# Altium footprint library SG_PCB_Fomin.PcbLib: 74 footprints (part 5 of 5)
Each footprint in its own frame and in the unit in brackets; x right, y up, seen from the top. Pads: shape width x height; smd on the part's side, far side on the other; paste and mask are expansions set on the pad; w line width, h text height; cw(c..) or ccw(c..) is an arc to the next point about the centre after c.
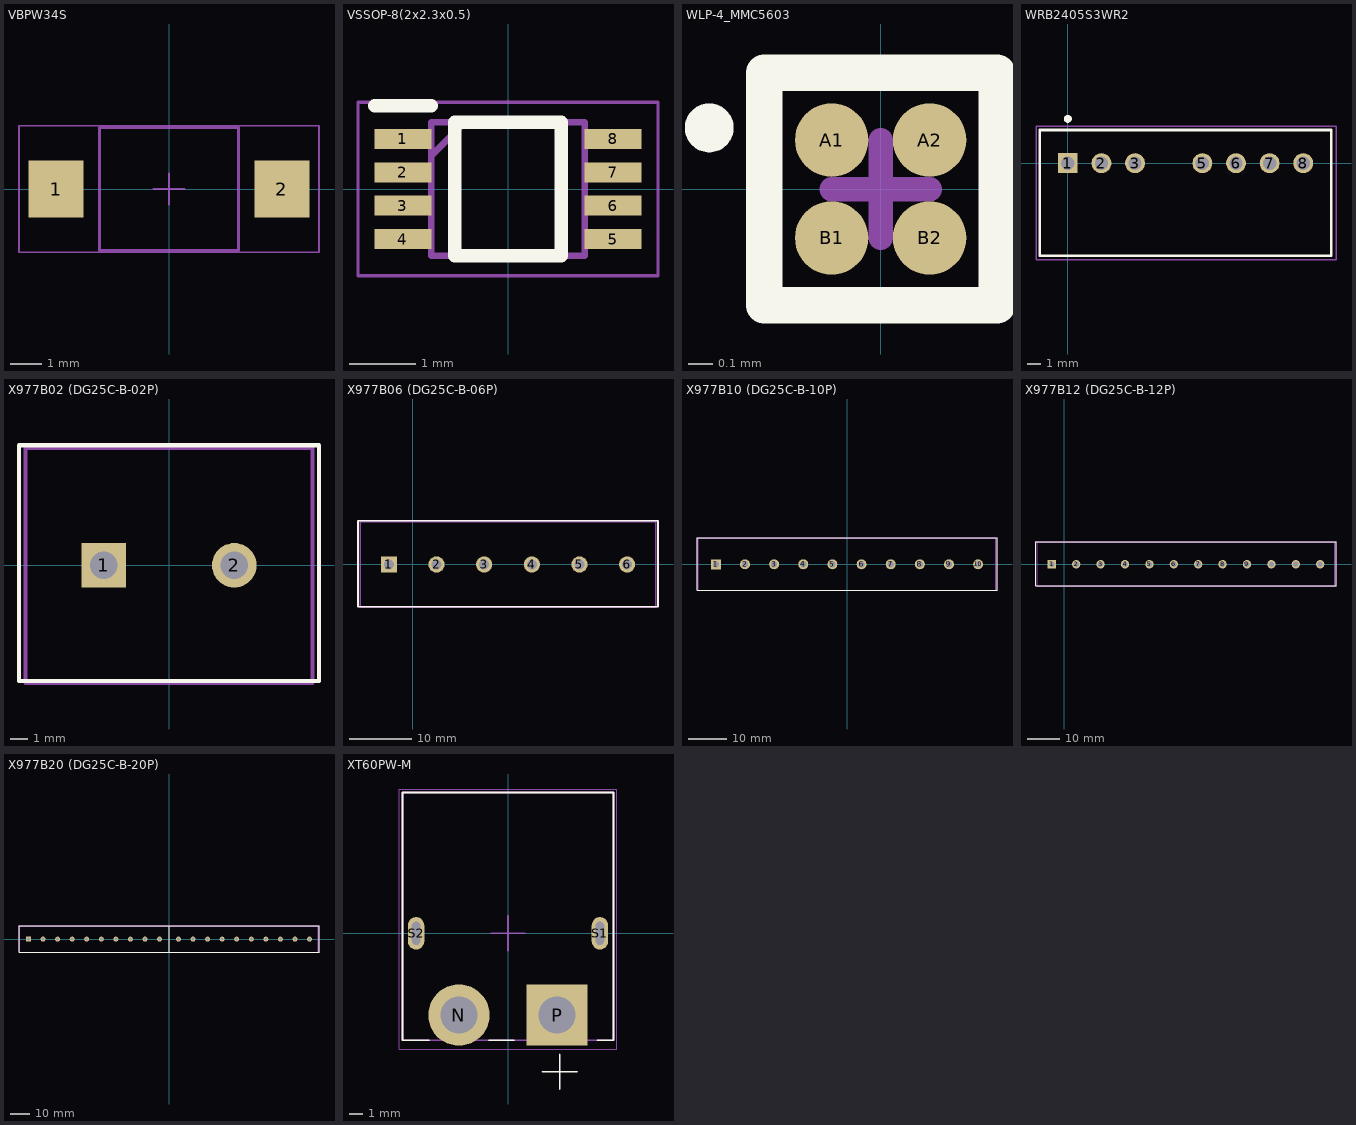
[diagram p4: the footprints below, top view; thin cyan lines are the x and y axes]

## VBPW34S [mm] "Photodiode"
pads (2):
  rect 1.75x1.8 smd: 1(-3.575,0) 2(3.575,0)
Top Courtyard:
  lines w0.05: -0.5,0 0.5,0 ; 0,-0.5 0,0.5 ; -4.75,-2 -4.75,2 4.75,2 4.75,-2 -4.75,-2
Top 3D Body:
  lines w0.1: -2.2,-1.95 2.2,-1.95 2.2,1.95 -2.2,1.95 -2.2,-1.95
3D body "User Library-bpw34s.step": height 1.22, standoff 0, extent -3.204,-1.95 3.204,1.95

## VSSOP-8(2x2.3x0.5) [mm]
pads (8):
  rect 0.85x0.3 smd: 1(-1.575,0.75) 2(-1.575,0.25) 3(-1.575,-0.25) 4(-1.575,-0.75) 5(1.575,-0.75) 6(1.575,-0.25) 7(1.575,0.25) 8(1.575,0.75)
Top Overlay:
  lines w0.2: -2,1.25 -1.15,1.25 ; -0.8,-1 -0.8,1 0.8,1 0.8,-1 -0.8,-1
Top Assembly:
  lines w0.1: -1.15,0.5 -0.65,1 ; -1.15,-1 -1.15,1 1.15,1 1.15,-1 -1.15,-1
Top Courtyard:
  lines w0.05: -2.25,-1.3 -2.25,1.3 2.25,1.3 2.25,-1.3 -2.25,-1.3
3D body "PCA9306DCUR.stp": height 0.77, standoff 0, extent -1.55,-1 1.55,1

## WLP-4_MMC5603 [mm]
pads (4):
  round 0.3 smd: A1(-0.2,0.2) A2(0.2,0.2) B1(-0.2,-0.2) B2(0.2,-0.2)
Top Overlay:
  lines w0.1: -0.7,0.2 ccw(c-0.7,0.25) -0.7,0.3 ccw(c-0.7,0.25) -0.7,0.2
  lines w0.15: -0.475,-0.475 0.475,-0.475 0.475,0.475 -0.475,0.475 -0.475,-0.475
Top Assembly:
  lines w0.05: -0.45,-0.45 0.45,-0.45 0.45,0.45 -0.45,0.45 -0.45,-0.45
Top Courtyard:
  lines w0.05: -0.475,-0.475 0.475,-0.475 0.475,0.475 -0.475,0.475 -0.475,-0.475
  lines w0.1: -0.2,0 0.2,0 ; 0,-0.2 0,0.2
Top Designator:
  text ".Designator" at -11.218,1.492 h1.52
3D body "MMC5603NJ.stp": height 0.7, standoff 0, extent -0.41,-0.41 0.41,0.41

## WRB2405S3WR2 [mm]
pads (7):
  rect 1.5x1.5 hole 1: 1(0,0)
  round 1.5 hole 1: 2(2.54,0) 3(5.08,0) 5(10.16,0) 6(12.7,0) 7(15.24,0) 8(17.78,0)
Top Overlay:
  lines w0.2: -2.11,-7 19.89,-7 19.89,2.5 -2.11,2.5 -2.11,-7
  lines w0.5: 0,3.3 cw(c0,3.35) 0,3.4 cw(c0,3.35) 0,3.3
Top Assembly:
  lines w0.1: -2.11,-7 -2.11,2.5 19.89,2.5 19.89,-7 -2.11,-7
Top Courtyard:
  lines w0.1: -2.4,-7.3 20.25,-7.3 20.25,2.8 -2.4,2.8 -2.4,-7.3
Top Designator:
  text ".Designator" at 4.2,-2.533 h0.8
3D body "WRB2405S-3WR2.stp": height 12.35, standoff -5, extent -2.11,-7 19.89,2.5

## X977B02 (DG25C-B-02P) [mm]
pads (2):
  rect 2.6x2.6 hole 1.6: 1(-3.81,0)
  round 2.6 hole 1.6: 2(3.81,0)
Top Overlay:
  lines w0.25: -8.75,-6.75 8.75,-6.75 8.75,7 -8.75,7 -8.75,-6.75
Top Assembly:
  lines w0.25: -8.37,-6.85 8.37,-6.85 8.37,6.85 -8.37,6.85 -8.37,-6.85
Top Courtyard:
  lines w0.2: -8.75,-6.75 8.75,-6.75 8.75,7 -8.75,7 -8.75,-6.75
Top Designator:
  text ".Designator" at -3.3,-0.033 h0.8
3D body "User Library-DG25C-1.STEP": height 14.8, standoff -4.79, extent -8.37,-6.484 8.37,6.75

## X977B06 (DG25C-B-06P) [mm]
pads (6):
  rect 2.6x2.6 hole 1.6: 1(-3.81,0)
  round 2.6 hole 1.6: 2(3.81,0) 3(11.43,0) 4(19.05,0) 5(26.67,0) 6(34.29,0)
Top Overlay:
  lines w0.25: 6.49,-6.75 23.99,-6.75 ; 6.49,7 23.99,7 ; 8.75,-6.75 -8.75,-6.75 -8.75,7 8.75,7 ; 21.73,-6.75 39.23,-6.75 39.23,7 21.73,7
Top Assembly:
  lines w0.25: 6.87,-6.85 23.61,-6.85 ; 6.87,6.85 23.61,6.85 ; 8.37,-6.85 -8.37,-6.85 -8.37,6.85 8.37,6.85 ; 22.11,-6.85 38.85,-6.85 38.85,6.85 22.11,6.85
Top Courtyard:
  lines w0.2: 6.49,-6.75 23.99,-6.75 ; 6.49,7 23.99,7 ; 8.75,-6.75 -8.75,-6.75 -8.75,7 8.75,7 ; 21.73,-6.75 39.23,-6.75 39.23,7 21.73,7
Top Designator:
  text ".Designator" at -3.3,-0.033 h0.8
3D body "User Library-DG25C-1.STEP": height 14.8, standoff -4.79, extent 22.11,-6.484 38.85,6.75
3D body "User Library-DG25C-1.STEP": height 14.8, standoff -4.79, extent 6.87,-6.484 23.61,6.75
3D body "User Library-DG25C-1.STEP": height 14.8, standoff -4.79, extent -8.37,-6.484 8.37,6.75

## X977B10 (DG25C-B-10P) [mm]
pads (10):
  rect 2.6x2.6 hole 1.6: 1(-34.29,0)
  round 2.6 hole 1.6: 2(-26.67,0) 3(-19.05,0) 4(-11.43,0) 5(-3.81,0) 6(3.81,0) 7(11.43,0) 8(19.05,0) 9(26.67,0) 10(34.29,0)
Top Overlay:
  lines w0.25: -23.99,-6.75 -6.49,-6.75 ; -23.99,7 -6.49,7 ; -21.73,-6.75 -39.23,-6.75 -39.23,7 -21.73,7 ; -8.75,-6.75 8.75,-6.75 ; -8.75,7 8.75,7 ; 6.49,-6.75 23.99,-6.75 ; 6.49,7 23.99,7 ; 21.73,-6.75 39.23,-6.75 39.23,7 21.73,7
Top Assembly:
  lines w0.25: -23.61,-6.85 -6.87,-6.85 ; -23.61,6.85 -6.87,6.85 ; -22.11,-6.85 -38.85,-6.85 -38.85,6.85 -22.11,6.85 ; -8.37,-6.85 8.37,-6.85 ; -8.37,6.85 8.37,6.85 ; 6.87,-6.85 23.61,-6.85 ; 6.87,6.85 23.61,6.85 ; 22.11,-6.85 38.85,-6.85 38.85,6.85 22.11,6.85
Top Courtyard:
  lines w0.2: -23.99,-6.75 -6.49,-6.75 ; -23.99,7 -6.49,7 ; -21.73,-6.75 -39.23,-6.75 -39.23,7 -21.73,7 ; -8.75,-6.75 8.75,-6.75 ; -8.75,7 8.75,7 ; 6.49,-6.75 23.99,-6.75 ; 6.49,7 23.99,7 ; 21.73,-6.75 39.23,-6.75 39.23,7 21.73,7
Top Designator:
  text ".Designator" at 0.2,0.467 h0.8
3D body "User Library-DG25C-1.STEP": height 14.8, standoff -4.79, extent 6.87,-6.484 23.61,6.75
3D body "User Library-DG25C-1.STEP": height 14.8, standoff -4.79, extent -8.37,-6.484 8.37,6.75
3D body "User Library-DG25C-1.STEP": height 14.8, standoff -4.79, extent -23.61,-6.484 -6.87,6.75
3D body "User Library-DG25C-1.STEP": height 14.8, standoff -4.79, extent -38.85,-6.484 -22.11,6.75
3D body "User Library-DG25C-1.STEP": height 14.8, standoff -4.79, extent 22.11,-6.484 38.85,6.75

## X977B12 (DG25C-B-12P) [mm]
pads (12):
  rect 2.6x2.6 hole 1.6: 1(-3.81,0)
  round 2.6 hole 1.6: 2(3.81,0) 3(11.43,0) 4(19.05,0) 5(26.67,0) 6(34.29,0) 7(41.91,0) 8(49.53,0) 9(57.15,0) 10(64.77,0) 11(72.39,0) 12(80.01,0)
Top Overlay:
  lines w0.25: 6.49,-6.75 23.99,-6.75 ; 6.49,7 23.99,7 ; 8.75,-6.75 -8.75,-6.75 -8.75,7 8.75,7 ; 21.73,-6.75 39.23,-6.75 ; 21.73,7 39.23,7 ; 36.97,-6.75 54.47,-6.75 ; 36.97,7 54.47,7 ; 52.21,-6.75 69.71,-6.75 ; 52.21,7 69.71,7 ; 67.45,-6.75 84.95,-6.75 84.95,7 67.45,7
Top Assembly:
  lines w0.25: 6.87,-6.85 23.61,-6.85 ; 6.87,6.85 23.61,6.85 ; 8.37,-6.85 -8.37,-6.85 -8.37,6.85 8.37,6.85 ; 22.11,-6.85 38.85,-6.85 ; 22.11,6.85 38.85,6.85 ; 37.35,-6.85 54.09,-6.85 ; 37.35,6.85 54.09,6.85 ; 52.59,-6.85 69.33,-6.85 ; 52.59,6.85 69.33,6.85 ; 67.83,-6.85 84.57,-6.85 84.57,6.85 67.83,6.85
Top Courtyard:
  lines w0.2: 6.49,-6.75 23.99,-6.75 ; 6.49,7 23.99,7 ; 8.75,-6.75 -8.75,-6.75 -8.75,7 8.75,7 ; 21.73,-6.75 39.23,-6.75 ; 21.73,7 39.23,7 ; 36.97,-6.75 54.47,-6.75 ; 36.97,7 54.47,7 ; 52.21,-6.75 69.71,-6.75 ; 52.21,7 69.71,7 ; 67.45,-6.75 84.95,-6.75 84.95,7 67.45,7
Top Designator:
  text ".Designator" at -3.3,-0.033 h0.8
3D body "User Library-DG25C-1.STEP": height 14.8, standoff -4.79, extent -8.37,-6.484 8.37,6.75
3D body "User Library-DG25C-1.STEP": height 14.8, standoff -4.79, extent 6.87,-6.484 23.61,6.75
3D body "User Library-DG25C-1.STEP": height 14.8, standoff -4.79, extent 22.11,-6.484 38.85,6.75
3D body "User Library-DG25C-1.STEP": height 14.8, standoff -4.79, extent 37.35,-6.484 54.09,6.75
3D body "User Library-DG25C-1.STEP": height 14.8, standoff -4.79, extent 52.59,-6.484 69.33,6.75
3D body "User Library-DG25C-1.STEP": height 14.8, standoff -4.79, extent 67.83,-6.484 84.57,6.75

## X977B20 (DG25C-B-20P) [mm]
pads (20):
  rect 2.6x2.6 hole 1.6: 1(-73.52,0)
  round 2.6 hole 1.6: 2(-65.9,0) 3(-58.28,0) 4(-50.66,0) 5(-43.04,0) 6(-35.42,0) 7(-27.8,0) 8(-20.18,0) 9(-12.56,0) 10(-4.94,0) 11(4.94,0) 12(12.56,0) 13(20.18,0) 14(27.8,0) 15(35.42,0) 16(43.04,0) 17(50.66,0) 18(58.28,0) 19(65.9,0) 20(73.52,0)
Top Overlay:
  lines w0.25: -63.22,-6.75 -45.72,-6.75 ; -63.22,7 -45.72,7 ; -60.96,-6.75 -78.46,-6.75 -78.46,7 -60.96,7 ; -47.98,-6.75 -30.48,-6.75 ; -47.98,7 -30.48,7 ; -32.74,-6.75 -15.24,-6.75 ; -32.74,7 -15.24,7 ; -17.5,-6.75 0,-6.75 ; -17.5,7 0,7 ; 15.24,-6.75 32.74,-6.75 ; 15.24,7 32.74,7 ; 17.5,-6.75 0,-6.75 ; 17.5,7 0,7 ; 30.48,-6.75 47.98,-6.75 ; 30.48,7 47.98,7 ; 45.72,-6.75 63.22,-6.75 ; 45.72,7 63.22,7 ; 60.96,-6.75 78.46,-6.75 78.46,7 60.96,7 ; 0,-6.75 0,7
Top Assembly:
  lines w0.25: -62.84,-6.85 -46.1,-6.85 ; -62.84,6.85 -46.1,6.85 ; -61.34,-6.85 -78.08,-6.85 -78.08,6.85 -61.34,6.85 ; -47.6,-6.85 -30.86,-6.85 ; -47.6,6.85 -30.86,6.85 ; -32.36,-6.85 -15.62,-6.85 ; -32.36,6.85 -15.62,6.85 ; -17.12,-6.85 -0.38,-6.85 ; -17.12,6.85 -0.38,6.85 ; 0.38,-6.85 17.12,-6.85 ; 0.38,6.85 17.12,6.85 ; 15.62,-6.85 32.36,-6.85 ; 15.62,6.85 32.36,6.85 ; 30.86,-6.85 47.6,-6.85 ; 30.86,6.85 47.6,6.85 ; 46.1,-6.85 62.84,-6.85 ; 46.1,6.85 62.84,6.85 ; 61.34,-6.85 78.08,-6.85 78.08,6.85 61.34,6.85
Top Courtyard:
  lines w0.2: -63.22,-6.75 -45.72,-6.75 ; -63.22,7 -45.72,7 ; -60.96,-6.75 -78.46,-6.75 -78.46,7 -60.96,7 ; -47.98,-6.75 -30.48,-6.75 ; -47.98,7 -30.48,7 ; -32.74,-6.75 -15.24,-6.75 ; -32.74,7 -15.24,7 ; -17.5,-6.75 0,-6.75 17.5,-6.75 ; -17.5,7 0,7 17.5,7 ; 15.24,-6.75 32.74,-6.75 ; 15.24,7 32.74,7 ; 30.48,-6.75 47.98,-6.75 ; 30.48,7 47.98,7 ; 45.72,-6.75 63.22,-6.75 ; 45.72,7 63.22,7 ; 60.96,-6.75 78.46,-6.75 78.46,7 60.96,7
Top Designator:
  text ".Designator" at -4.711,1.851 h0.8
3D body "User Library-DG25C-1.STEP": height 14.8, standoff -4.79, extent -17.12,-6.484 -0.38,6.75
3D body "User Library-DG25C-1.STEP": height 14.8, standoff -4.79, extent -78.08,-6.484 -61.34,6.75
3D body "User Library-DG25C-1.STEP": height 14.8, standoff -4.79, extent -62.84,-6.484 -46.1,6.75
3D body "User Library-DG25C-1.STEP": height 14.8, standoff -4.79, extent -47.6,-6.484 -30.86,6.75
3D body "User Library-DG25C-1.STEP": height 14.8, standoff -4.79, extent -32.36,-6.484 -15.62,6.75
3D body "User Library-DG25C-1.STEP": height 14.8, standoff -4.79, extent 61.34,-6.484 78.08,6.75
3D body "User Library-DG25C-1.STEP": height 14.8, standoff -4.79, extent 0.38,-6.484 17.12,6.75
3D body "User Library-DG25C-1.STEP": height 14.8, standoff -4.79, extent 15.62,-6.484 32.36,6.75
3D body "User Library-DG25C-1.STEP": height 14.8, standoff -4.79, extent 30.86,-6.484 47.6,6.75
3D body "User Library-DG25C-1.STEP": height 14.8, standoff -4.79, extent 46.1,-6.484 62.84,6.75

## XT60PW-M [mm] "Power connector"
height 8.4
pads (4):
  round 4.5 hole 2.7: N(-3.6,-6)
  rect 4.5x4.5 hole 2.7: P(3.6,-6)
  oval 1.2x2.4 hole 0.6 slot 1.7 at 90 deg: S1(6.75,0) S2(-6.75,0)
Top Overlay:
  lines w0.127: -5.778,-7.85 -7.75,-7.85 -7.75,10.35 7.75,10.35 7.75,-7.85 6.577,-7.85 ; -1.422,-7.85 0.447,-7.849 ; 2.54,-10.16 3.81,-10.16 ; 3.81,-11.43 3.81,-10.16 ; 3.81,-8.89 3.81,-10.16 ; 5.08,-10.16 3.81,-10.16
Top Assembly:
  lines w0.127: -7.75,-7.85 7.75,-7.85 7.75,10.35 -7.75,10.35 -7.75,-7.85
Top Courtyard:
  lines w0.05: -8,-8.5 8,-8.5 8,10.6 -8,10.6 -8,-8.5
  lines w0.127: -1.27,0 0,0 ; 0,-1.27 0,0 ; 0,1.27 0,0 ; 1.27,0 0,0
3D body "step_temp.STEP": height 8.4, standoff -2.55, extent -7.75,-7.85 7.75,10.35